# Altium schematic symbol library jlcpcb_2025_04_capacitors_extended_0603.schlib: 3668 symbols (part 15 of 20) (continued)
## FN18X821K500PSG
designator C?  Capacitance: 820pF  (hidden comment: *)
Capacitor, Ceramic (MLCC), 820pF, ±10%, 50V, X7R, ±10%, SMD 0603; Manufacturer: PSA(Prosperity Dielectrics); Manufacturer Part Number: FN18X821K500PSG; Package Size: 0603; JLCPCB Basic Part: No; JLCPCB Part Number: C565602; Supplier 1: LCSC; Category: Capacitors - MLCC; Supplier Part Number 1: C565602; Tolerance: ±10%; Voltage Rating: 50V; Temperature Coefficient: X7R; RoHS: Yes; ComponentLink1Description: Datasheet; ComponentLink1URL: https://wmsc.lcsc.com/wmsc/upload/file/pdf/v2/lcsc/2304140030_PSA-Prosperity-Dielectrics-FN18X821K500PSG_C565602.pdf; ComponentLink2Description: JLCPCB Part URL; ComponentLink2URL: https://jlcpcb.com/partdetail/C565602; ComponentLink3Description: LCSC Part URL; ComponentLink3URL: https://lcsc.com/product-detail/Multilayer-Ceramic-Capacitors-MLCC---SMD-SMT_PSAProsperity-Dielectrics-PSAProsperity-Dielectrics-FN18X821K500PSG_C565602.html
footprint CAP-0603 (0603 (1608M) Capacitor)
pins: 1, 2

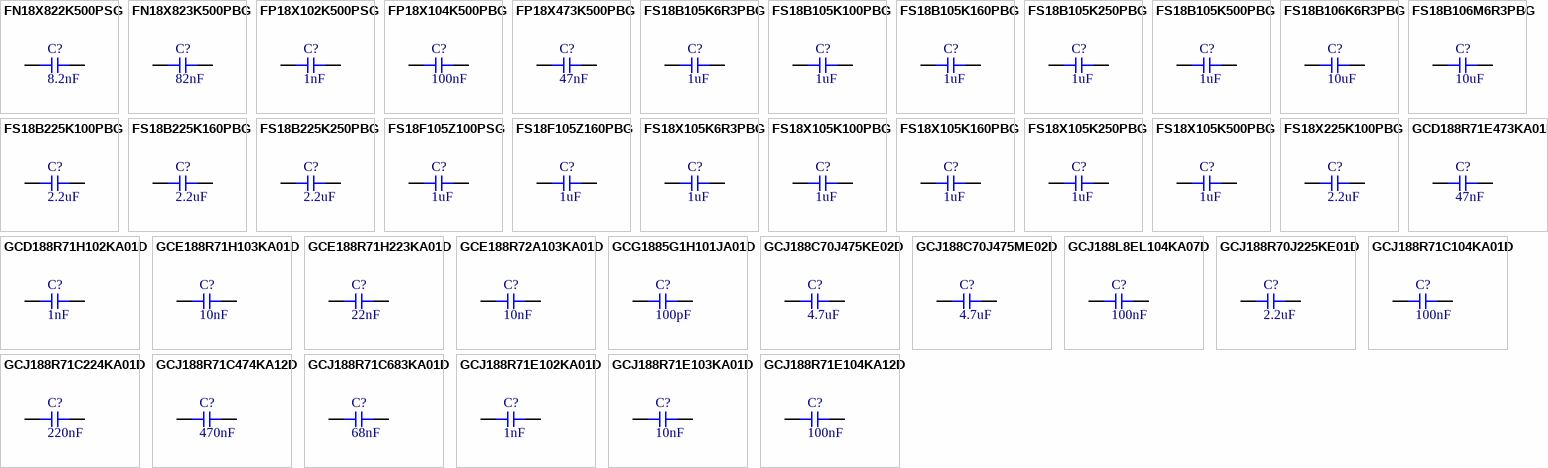
[diagram p66: symbols FN18X822K500PSG to GCJ188R71E104KA12D]

## FN18X822K500PSG
designator C?  Capacitance: 8.2nF  (hidden comment: *)
Capacitor, Ceramic (MLCC), 8.2nF, ±10%, 50V, X7R, ±10%, SMD 0603; Manufacturer: PSA(Prosperity Dielectrics); Manufacturer Part Number: FN18X822K500PSG; Package Size: 0603; JLCPCB Basic Part: No; JLCPCB Part Number: C565603; Supplier 1: LCSC; Category: Capacitors - MLCC; Supplier Part Number 1: C565603; Tolerance: ±10%; Voltage Rating: 50V; Temperature Coefficient: X7R; RoHS: Yes; ComponentLink1Description: Datasheet; ComponentLink1URL: https://wmsc.lcsc.com/wmsc/upload/file/pdf/v2/lcsc/2304140030_PSA-Prosperity-Dielectrics-FN18X822K500PSG_C565603.pdf; ComponentLink2Description: JLCPCB Part URL; ComponentLink2URL: https://jlcpcb.com/partdetail/C565603; ComponentLink3Description: LCSC Part URL; ComponentLink3URL: https://lcsc.com/product-detail/Multilayer-Ceramic-Capacitors-MLCC---SMD-SMT_PSAProsperity-Dielectrics-PSAProsperity-Dielectrics-FN18X822K500PSG_C565603.html
footprint CAP-0603 (0603 (1608M) Capacitor)
pins: 1, 2

## FN18X823K500PBG
designator C?  Capacitance: 82nF  (hidden comment: *)
Capacitor, Ceramic (MLCC), 82nF, ±10%, 50V, X7R, ±10%, SMD 0603; Manufacturer: PSA(Prosperity Dielectrics); Manufacturer Part Number: FN18X823K500PBG; Package Size: 0603; JLCPCB Basic Part: No; JLCPCB Part Number: C565604; Supplier 1: LCSC; Category: Capacitors - MLCC; Supplier Part Number 1: C565604; Tolerance: ±10%; Voltage Rating: 50V; Temperature Coefficient: X7R; RoHS: Yes; ComponentLink1Description: Datasheet; ComponentLink1URL: https://wmsc.lcsc.com/wmsc/upload/file/pdf/v2/lcsc/2304140030_PSA-Prosperity-Dielectrics-FN18X823K500PBG_C565604.pdf; ComponentLink2Description: JLCPCB Part URL; ComponentLink2URL: https://jlcpcb.com/partdetail/C565604; ComponentLink3Description: LCSC Part URL; ComponentLink3URL: https://lcsc.com/product-detail/Multilayer-Ceramic-Capacitors-MLCC---SMD-SMT_PSAProsperity-Dielectrics-PSAProsperity-Dielectrics-FN18X823K500PBG_C565604.html
footprint CAP-0603 (0603 (1608M) Capacitor)
pins: 1, 2

## FP18X102K500PSG
designator C?  Capacitance: 1nF  (hidden comment: *)
Capacitor, Ceramic (MLCC), 1nF, 50V, X7R, SMD 0603; Manufacturer: PSA(Prosperity Dielectrics); Manufacturer Part Number: FP18X102K500PSG; Package Size: 0603; JLCPCB Basic Part: No; JLCPCB Part Number: C2929176; Supplier 1: LCSC; Category: Capacitors - MLCC; Supplier Part Number 1: C2929176; Voltage Rating: 50V; Temperature Coefficient: X7R; RoHS: Yes; ComponentLink1Description: Datasheet; ComponentLink1URL: https://wmsc.lcsc.com/wmsc/upload/file/pdf/v2/lcsc/2201121400_PSA-Prosperity-Dielectrics-FP18X102K500PSG_C2929176.pdf; ComponentLink2Description: JLCPCB Part URL; ComponentLink2URL: https://jlcpcb.com/partdetail/C2929176; ComponentLink3Description: LCSC Part URL; ComponentLink3URL: https://lcsc.com/product-detail/Multilayer-Ceramic-Capacitors-MLCC---SMD-SMT_PSAProsperity-Dielectrics-PSAProsperity-Dielectrics-FP18X102K500PSG_C2929176.html
footprint CAP-0603 (0603 (1608M) Capacitor)
pins: 1, 2

## FP18X104K500PBG
designator C?  Capacitance: 100nF  (hidden comment: *)
Capacitor, Ceramic (MLCC), 100nF, 50V, X7R, SMD 0603; Manufacturer: PSA(Prosperity Dielectrics); Manufacturer Part Number: FP18X104K500PBG; Package Size: 0603; JLCPCB Basic Part: No; JLCPCB Part Number: C2929177; Supplier 1: LCSC; Category: Capacitors - MLCC; Supplier Part Number 1: C2929177; Voltage Rating: 50V; Temperature Coefficient: X7R; RoHS: Yes; ComponentLink1Description: Datasheet; ComponentLink1URL: https://wmsc.lcsc.com/wmsc/upload/file/pdf/v2/lcsc/2201121400_PSA-Prosperity-Dielectrics-FP18X104K500PBG_C2929177.pdf; ComponentLink2Description: JLCPCB Part URL; ComponentLink2URL: https://jlcpcb.com/partdetail/C2929177; ComponentLink3Description: LCSC Part URL; ComponentLink3URL: https://lcsc.com/product-detail/Multilayer-Ceramic-Capacitors-MLCC---SMD-SMT_PSAProsperity-Dielectrics-PSAProsperity-Dielectrics-FP18X104K500PBG_C2929177.html
footprint CAP-0603 (0603 (1608M) Capacitor)
pins: 1, 2

## FP18X473K500PBG
designator C?  Capacitance: 47nF  (hidden comment: *)
Capacitor, Ceramic (MLCC), 47nF, ±10%, 50V, X7R, ±10%, SMD 0603; Manufacturer: PSA(Prosperity Dielectrics); Manufacturer Part Number: FP18X473K500PBG; Package Size: 0603; JLCPCB Basic Part: No; JLCPCB Part Number: C525319; Supplier 1: LCSC; Category: Capacitors - MLCC; Supplier Part Number 1: C525319; Tolerance: ±10%; Voltage Rating: 50V; Temperature Coefficient: X7R; RoHS: Yes; ComponentLink1Description: Datasheet; ComponentLink1URL: https://wmsc.lcsc.com/wmsc/upload/file/pdf/v2/lcsc/2304140030_PSA-Prosperity-Dielectrics-FP18X473K500PBG_C525319.pdf; ComponentLink2Description: JLCPCB Part URL; ComponentLink2URL: https://jlcpcb.com/partdetail/C525319; ComponentLink3Description: LCSC Part URL; ComponentLink3URL: https://lcsc.com/product-detail/Multilayer-Ceramic-Capacitors-MLCC---SMD-SMT_PSAProsperity-Dielectrics-PSAProsperity-Dielectrics-FP18X473K500PBG_C525319.html
footprint CAP-0603 (0603 (1608M) Capacitor)
pins: 1, 2

## FS18B105K6R3PBG
designator C?  Capacitance: 1uF  (hidden comment: *)
Capacitor, Ceramic (MLCC), 1uF, ±10%, 6.3V, X5R, ±10%, SMD 0603; Manufacturer: PSA(Prosperity Dielectrics); Manufacturer Part Number: FS18B105K6R3PBG; Package Size: 0603; JLCPCB Basic Part: No; JLCPCB Part Number: C525331; Supplier 1: LCSC; Category: Capacitors - MLCC; Supplier Part Number 1: C525331; Tolerance: ±10%; Voltage Rating: 6.3V; Temperature Coefficient: X5R; RoHS: Yes; ComponentLink1Description: Datasheet; ComponentLink1URL: https://wmsc.lcsc.com/wmsc/upload/file/pdf/v2/lcsc/2304140030_PSA-Prosperity-Dielectrics-FS18B105K6R3PBG_C525331.pdf; ComponentLink2Description: JLCPCB Part URL; ComponentLink2URL: https://jlcpcb.com/partdetail/C525331; ComponentLink3Description: LCSC Part URL; ComponentLink3URL: https://lcsc.com/product-detail/Multilayer-Ceramic-Capacitors-MLCC---SMD-SMT_PSAProsperity-Dielectrics-PSAProsperity-Dielectrics-FS18B105K6R3PBG_C525331.html
footprint CAP-0603 (0603 (1608M) Capacitor)
pins: 1, 2

## FS18B105K100PBG
designator C?  Capacitance: 1uF  (hidden comment: *)
Capacitor, Ceramic (MLCC), 1uF, ±10%, 10V, X5R, ±10%, SMD 0603; Manufacturer: PSA(Prosperity Dielectrics); Manufacturer Part Number: FS18B105K100PBG; Package Size: 0603; JLCPCB Basic Part: No; JLCPCB Part Number: C363553; Supplier 1: LCSC; Category: Capacitors - MLCC; Supplier Part Number 1: C363553; Tolerance: ±10%; Voltage Rating: 10V; Temperature Coefficient: X5R; RoHS: Yes; ComponentLink1Description: Datasheet; ComponentLink1URL: https://wmsc.lcsc.com/wmsc/upload/file/pdf/v2/lcsc/2304140030_PSA-Prosperity-Dielectrics-FS18B105K100PBG_C363553.pdf; ComponentLink2Description: JLCPCB Part URL; ComponentLink2URL: https://jlcpcb.com/partdetail/C363553; ComponentLink3Description: LCSC Part URL; ComponentLink3URL: https://lcsc.com/product-detail/Multilayer-Ceramic-Capacitors-MLCC---SMD-SMT_PSAProsperity-Dielectrics-PSAProsperity-Dielectrics-FS18B105K100PBG_C363553.html
footprint CAP-0603 (0603 (1608M) Capacitor)
pins: 1, 2

## FS18B105K160PBG
designator C?  Capacitance: 1uF  (hidden comment: *)
Capacitor, Ceramic (MLCC), 1uF, ±10%, 16V, X5R, ±10%, SMD 0603; Manufacturer: PSA(Prosperity Dielectrics); Manufacturer Part Number: FS18B105K160PBG; Package Size: 0603; JLCPCB Basic Part: No; JLCPCB Part Number: C328910; Supplier 1: LCSC; Category: Capacitors - MLCC; Supplier Part Number 1: C328910; Tolerance: ±10%; Voltage Rating: 16V; Temperature Coefficient: X5R; RoHS: Yes; ComponentLink1Description: Datasheet; ComponentLink1URL: https://wmsc.lcsc.com/wmsc/upload/file/pdf/v2/lcsc/2304140030_PSA-Prosperity-Dielectrics-FS18B105K160PBG_C328910.pdf; ComponentLink2Description: JLCPCB Part URL; ComponentLink2URL: https://jlcpcb.com/partdetail/C328910; ComponentLink3Description: LCSC Part URL; ComponentLink3URL: https://lcsc.com/product-detail/Multilayer-Ceramic-Capacitors-MLCC---SMD-SMT_PSAProsperity-Dielectrics-PSAProsperity-Dielectrics-FS18B105K160PBG_C328910.html
footprint CAP-0603 (0603 (1608M) Capacitor)
pins: 1, 2

## FS18B105K250PBG
designator C?  Capacitance: 1uF  (hidden comment: *)
Capacitor, Ceramic (MLCC), 1uF, ±10%, 25V, X5R, ±10%, SMD 0603; Manufacturer: PSA(Prosperity Dielectrics); Manufacturer Part Number: FS18B105K250PBG; Package Size: 0603; JLCPCB Basic Part: No; JLCPCB Part Number: C525329; Supplier 1: LCSC; Category: Capacitors - MLCC; Supplier Part Number 1: C525329; Tolerance: ±10%; Voltage Rating: 25V; Temperature Coefficient: X5R; RoHS: Yes; ComponentLink1Description: Datasheet; ComponentLink1URL: https://wmsc.lcsc.com/wmsc/upload/file/pdf/v2/lcsc/2304140030_PSA-Prosperity-Dielectrics-FS18B105K250PBG_C525329.pdf; ComponentLink2Description: JLCPCB Part URL; ComponentLink2URL: https://jlcpcb.com/partdetail/C525329; ComponentLink3Description: LCSC Part URL; ComponentLink3URL: https://lcsc.com/product-detail/Multilayer-Ceramic-Capacitors-MLCC---SMD-SMT_PSAProsperity-Dielectrics-PSAProsperity-Dielectrics-FS18B105K250PBG_C525329.html
footprint CAP-0603 (0603 (1608M) Capacitor)
pins: 1, 2

## FS18B105K500PBG
designator C?  Capacitance: 1uF  (hidden comment: *)
Capacitor, Ceramic (MLCC), 1uF, ±10%, 50V, X5R, ±10%, SMD 0603; Manufacturer: PSA(Prosperity Dielectrics); Manufacturer Part Number: FS18B105K500PBG; Package Size: 0603; JLCPCB Basic Part: No; JLCPCB Part Number: C525330; Supplier 1: LCSC; Category: Capacitors - MLCC; Supplier Part Number 1: C525330; Tolerance: ±10%; Voltage Rating: 50V; Temperature Coefficient: X5R; RoHS: Yes; ComponentLink1Description: Datasheet; ComponentLink1URL: https://wmsc.lcsc.com/wmsc/upload/file/pdf/v2/lcsc/2304140030_PSA-Prosperity-Dielectrics-FS18B105K500PBG_C525330.pdf; ComponentLink2Description: JLCPCB Part URL; ComponentLink2URL: https://jlcpcb.com/partdetail/C525330; ComponentLink3Description: LCSC Part URL; ComponentLink3URL: https://lcsc.com/product-detail/Multilayer-Ceramic-Capacitors-MLCC---SMD-SMT_PSAProsperity-Dielectrics-PSAProsperity-Dielectrics-FS18B105K500PBG_C525330.html
footprint CAP-0603 (0603 (1608M) Capacitor)
pins: 1, 2

## FS18B106K6R3PBG
designator C?  Capacitance: 10uF  (hidden comment: *)
Capacitor, Ceramic (MLCC), 10uF, ±10%, 6.3V, ±10%, SMD 0603; Manufacturer: PSA(Prosperity Dielectrics); Manufacturer Part Number: FS18B106K6R3PBG; Package Size: 0603; JLCPCB Basic Part: No; JLCPCB Part Number: C2836875; Supplier 1: LCSC; Category: Capacitors - MLCC; Supplier Part Number 1: C2836875; Tolerance: ±10%; Voltage Rating: 6.3V; RoHS: Yes; ComponentLink1Description: Datasheet; ComponentLink1URL: https://wmsc.lcsc.com/wmsc/upload/file/pdf/v2/lcsc/2304140030_PSA-Prosperity-Dielectrics-FS18B106K6R3PBG_C2836875.pdf; ComponentLink2Description: JLCPCB Part URL; ComponentLink2URL: https://jlcpcb.com/partdetail/C2836875; ComponentLink3Description: LCSC Part URL; ComponentLink3URL: https://lcsc.com/product-detail/Multilayer-Ceramic-Capacitors-MLCC---SMD-SMT_PSAProsperity-Dielectrics-PSAProsperity-Dielectrics-FS18B106K6R3PBG_C2836875.html
footprint CAP-0603 (0603 (1608M) Capacitor)
pins: 1, 2

## FS18B106M6R3PBG
designator C?  Capacitance: 10uF  (hidden comment: *)
Capacitor, Ceramic (MLCC), 10uF, ±20%, 6.3V, ±20%, SMD 0603; Manufacturer: PSA(Prosperity Dielectrics); Manufacturer Part Number: FS18B106M6R3PBG; Package Size: 0603; JLCPCB Basic Part: No; JLCPCB Part Number: C2836876; Supplier 1: LCSC; Category: Capacitors - MLCC; Supplier Part Number 1: C2836876; Tolerance: ±20%; Voltage Rating: 6.3V; RoHS: Yes; ComponentLink1Description: Datasheet; ComponentLink1URL: https://wmsc.lcsc.com/wmsc/upload/file/pdf/v2/lcsc/2304140030_PSA-Prosperity-Dielectrics-FS18B106M6R3PBG_C2836876.pdf; ComponentLink2Description: JLCPCB Part URL; ComponentLink2URL: https://jlcpcb.com/partdetail/C2836876; ComponentLink3Description: LCSC Part URL; ComponentLink3URL: https://lcsc.com/product-detail/Multilayer-Ceramic-Capacitors-MLCC---SMD-SMT_PSAProsperity-Dielectrics-PSAProsperity-Dielectrics-FS18B106M6R3PBG_C2836876.html
footprint CAP-0603 (0603 (1608M) Capacitor)
pins: 1, 2

## FS18B225K100PBG
designator C?  Capacitance: 2.2uF  (hidden comment: *)
Capacitor, Ceramic (MLCC), 2.2uF, ±10%, 10V, X5R, ±10%, SMD 0603; Manufacturer: PSA(Prosperity Dielectrics); Manufacturer Part Number: FS18B225K100PBG; Package Size: 0603; JLCPCB Basic Part: No; JLCPCB Part Number: C2847427; Supplier 1: LCSC; Category: Capacitors - MLCC; Supplier Part Number 1: C2847427; Tolerance: ±10%; Voltage Rating: 10V; Temperature Coefficient: X5R; RoHS: Yes; ComponentLink1Description: Datasheet; ComponentLink1URL: https://wmsc.lcsc.com/wmsc/upload/file/pdf/v2/lcsc/2108142130_PSA-Prosperity-Dielectrics-FS18B225K100PBG_C2847427.pdf; ComponentLink2Description: JLCPCB Part URL; ComponentLink2URL: https://jlcpcb.com/partdetail/C2847427; ComponentLink3Description: LCSC Part URL; ComponentLink3URL: https://lcsc.com/product-detail/Multilayer-Ceramic-Capacitors-MLCC---SMD-SMT_PSAProsperity-Dielectrics-PSAProsperity-Dielectrics-FS18B225K100PBG_C2847427.html
footprint CAP-0603 (0603 (1608M) Capacitor)
pins: 1, 2

## FS18B225K160PBG
designator C?  Capacitance: 2.2uF  (hidden comment: *)
Capacitor, Ceramic (MLCC), 2.2uF, 16V, X5R, SMD 0603; Manufacturer: PSA(Prosperity Dielectrics); Manufacturer Part Number: FS18B225K160PBG; Package Size: 0603; JLCPCB Basic Part: No; JLCPCB Part Number: C2874748; Supplier 1: LCSC; Category: Capacitors - MLCC; Supplier Part Number 1: C2874748; Voltage Rating: 16V; Temperature Coefficient: X5R; RoHS: Yes; ComponentLink1Description: Datasheet; ComponentLink1URL: https://wmsc.lcsc.com/wmsc/upload/file/pdf/v2/lcsc/2108150330_PSA-Prosperity-Dielectrics-FS18B225K160PBG_C2874748.pdf; ComponentLink2Description: JLCPCB Part URL; ComponentLink2URL: https://jlcpcb.com/partdetail/C2874748; ComponentLink3Description: LCSC Part URL; ComponentLink3URL: https://lcsc.com/product-detail/Multilayer-Ceramic-Capacitors-MLCC---SMD-SMT_PSAProsperity-Dielectrics-PSAProsperity-Dielectrics-FS18B225K160PBG_C2874748.html
footprint CAP-0603 (0603 (1608M) Capacitor)
pins: 1, 2

## FS18B225K250PBG
designator C?  Capacitance: 2.2uF  (hidden comment: *)
Capacitor, Ceramic (MLCC), 2.2uF, 25V, X5R, SMD 0603; Manufacturer: PSA(Prosperity Dielectrics); Manufacturer Part Number: FS18B225K250PBG; Package Size: 0603; JLCPCB Basic Part: No; JLCPCB Part Number: C2929194; Supplier 1: LCSC; Category: Capacitors - MLCC; Supplier Part Number 1: C2929194; Voltage Rating: 25V; Temperature Coefficient: X5R; RoHS: Yes; ComponentLink1Description: Datasheet; ComponentLink1URL: https://wmsc.lcsc.com/wmsc/upload/file/pdf/v2/lcsc/2201121400_PSA-Prosperity-Dielectrics-FS18B225K250PBG_C2929194.pdf; ComponentLink2Description: JLCPCB Part URL; ComponentLink2URL: https://jlcpcb.com/partdetail/C2929194; ComponentLink3Description: LCSC Part URL; ComponentLink3URL: https://lcsc.com/product-detail/Multilayer-Ceramic-Capacitors-MLCC---SMD-SMT_PSAProsperity-Dielectrics-PSAProsperity-Dielectrics-FS18B225K250PBG_C2929194.html
footprint CAP-0603 (0603 (1608M) Capacitor)
pins: 1, 2

## FS18F105Z100PSG
designator C?  Capacitance: 1uF  (hidden comment: *)
Capacitor, Ceramic (MLCC), 1uF, 10V, Y5V, SMD 0603; Manufacturer: PSA(Prosperity Dielectrics); Manufacturer Part Number: FS18F105Z100PSG; Temperature Rating: -20%~+80%; Package Size: 0603; JLCPCB Basic Part: No; JLCPCB Part Number: C363559; Supplier 1: LCSC; Category: Capacitors - MLCC; Supplier Part Number 1: C363559; Voltage Rating: 10V; Temperature Coefficient: Y5V; RoHS: Yes; ComponentLink1Description: Datasheet; ComponentLink1URL: https://wmsc.lcsc.com/wmsc/upload/file/pdf/v2/lcsc/2304140030_PSA-Prosperity-Dielectrics-FS18F105Z100PSG_C363559.pdf; ComponentLink2Description: JLCPCB Part URL; ComponentLink2URL: https://jlcpcb.com/partdetail/C363559; ComponentLink3Description: LCSC Part URL; ComponentLink3URL: https://lcsc.com/product-detail/Multilayer-Ceramic-Capacitors-MLCC---SMD-SMT_PSAProsperity-Dielectrics-PSAProsperity-Dielectrics-FS18F105Z100PSG_C363559.html
footprint CAP-0603 (0603 (1608M) Capacitor)
pins: 1, 2

## FS18F105Z160PBG
designator C?  Capacitance: 1uF  (hidden comment: *)
Capacitor, Ceramic (MLCC), 1uF, 16V, Y5V, SMD 0603; Manufacturer: PSA(Prosperity Dielectrics); Manufacturer Part Number: FS18F105Z160PBG; Temperature Rating: -20%~+80%; Package Size: 0603; JLCPCB Basic Part: No; JLCPCB Part Number: C363560; Supplier 1: LCSC; Category: Capacitors - MLCC; Supplier Part Number 1: C363560; Voltage Rating: 16V; Temperature Coefficient: Y5V; RoHS: Yes; ComponentLink1Description: Datasheet; ComponentLink1URL: https://wmsc.lcsc.com/wmsc/upload/file/pdf/v2/lcsc/2304140030_PSA-Prosperity-Dielectrics-FS18F105Z160PBG_C363560.pdf; ComponentLink2Description: JLCPCB Part URL; ComponentLink2URL: https://jlcpcb.com/partdetail/C363560; ComponentLink3Description: LCSC Part URL; ComponentLink3URL: https://lcsc.com/product-detail/Multilayer-Ceramic-Capacitors-MLCC---SMD-SMT_PSAProsperity-Dielectrics-PSAProsperity-Dielectrics-FS18F105Z160PBG_C363560.html
footprint CAP-0603 (0603 (1608M) Capacitor)
pins: 1, 2

## FS18X105K6R3PBG
designator C?  Capacitance: 1uF  (hidden comment: *)
Capacitor, Ceramic (MLCC), 1uF, ±10%, 6.3V, X7R, ±10%, SMD 0603; Manufacturer: PSA(Prosperity Dielectrics); Manufacturer Part Number: FS18X105K6R3PBG; Package Size: 0603; JLCPCB Basic Part: No; JLCPCB Part Number: C525335; Supplier 1: LCSC; Category: Capacitors - MLCC; Supplier Part Number 1: C525335; Tolerance: ±10%; Voltage Rating: 6.3V; Temperature Coefficient: X7R; RoHS: Yes; ComponentLink1Description: Datasheet; ComponentLink1URL: https://wmsc.lcsc.com/wmsc/upload/file/pdf/v2/lcsc/2304140030_PSA-Prosperity-Dielectrics-FS18X105K6R3PBG_C525335.pdf; ComponentLink2Description: JLCPCB Part URL; ComponentLink2URL: https://jlcpcb.com/partdetail/C525335; ComponentLink3Description: LCSC Part URL; ComponentLink3URL: https://lcsc.com/product-detail/Multilayer-Ceramic-Capacitors-MLCC---SMD-SMT_PSAProsperity-Dielectrics-PSAProsperity-Dielectrics-FS18X105K6R3PBG_C525335.html
footprint CAP-0603 (0603 (1608M) Capacitor)
pins: 1, 2

## FS18X105K100PBG
designator C?  Capacitance: 1uF  (hidden comment: *)
Capacitor, Ceramic (MLCC), 1uF, ±10%, 10V, X7R, ±10%, SMD 0603; Manufacturer: PSA(Prosperity Dielectrics); Manufacturer Part Number: FS18X105K100PBG; Package Size: 0603; JLCPCB Basic Part: No; JLCPCB Part Number: C525332; Supplier 1: LCSC; Category: Capacitors - MLCC; Supplier Part Number 1: C525332; Tolerance: ±10%; Voltage Rating: 10V; Temperature Coefficient: X7R; RoHS: Yes; ComponentLink1Description: Datasheet; ComponentLink1URL: https://wmsc.lcsc.com/wmsc/upload/file/pdf/v2/lcsc/2304140030_PSA-Prosperity-Dielectrics-FS18X105K100PBG_C525332.pdf; ComponentLink2Description: JLCPCB Part URL; ComponentLink2URL: https://jlcpcb.com/partdetail/C525332; ComponentLink3Description: LCSC Part URL; ComponentLink3URL: https://lcsc.com/product-detail/Multilayer-Ceramic-Capacitors-MLCC---SMD-SMT_PSAProsperity-Dielectrics-PSAProsperity-Dielectrics-FS18X105K100PBG_C525332.html
footprint CAP-0603 (0603 (1608M) Capacitor)
pins: 1, 2

## FS18X105K160PBG
designator C?  Capacitance: 1uF  (hidden comment: *)
Capacitor, Ceramic (MLCC), 1uF, ±10%, 16V, X7R, ±10%, SMD 0603; Manufacturer: PSA(Prosperity Dielectrics); Manufacturer Part Number: FS18X105K160PBG; Package Size: 0603; JLCPCB Basic Part: No; JLCPCB Part Number: C436246; Supplier 1: LCSC; Category: Capacitors - MLCC; Supplier Part Number 1: C436246; Tolerance: ±10%; Voltage Rating: 16V; Temperature Coefficient: X7R; RoHS: Yes; ComponentLink1Description: Datasheet; ComponentLink1URL: https://wmsc.lcsc.com/wmsc/upload/file/pdf/v2/lcsc/2304140030_PSA-Prosperity-Dielectrics-FS18X105K160PBG_C436246.pdf; ComponentLink2Description: JLCPCB Part URL; ComponentLink2URL: https://jlcpcb.com/partdetail/C436246; ComponentLink3Description: LCSC Part URL; ComponentLink3URL: https://lcsc.com/product-detail/Multilayer-Ceramic-Capacitors-MLCC---SMD-SMT_PSAProsperity-Dielectrics-PSAProsperity-Dielectrics-FS18X105K160PBG_C436246.html
footprint CAP-0603 (0603 (1608M) Capacitor)
pins: 1, 2

## FS18X105K250PBG
designator C?  Capacitance: 1uF  (hidden comment: *)
Capacitor, Ceramic (MLCC), 1uF, ±10%, 25V, X7R, ±10%, SMD 0603; Manufacturer: PSA(Prosperity Dielectrics); Manufacturer Part Number: FS18X105K250PBG; Package Size: 0603; JLCPCB Basic Part: No; JLCPCB Part Number: C525333; Supplier 1: LCSC; Category: Capacitors - MLCC; Supplier Part Number 1: C525333; Tolerance: ±10%; Voltage Rating: 25V; Temperature Coefficient: X7R; RoHS: Yes; ComponentLink1Description: Datasheet; ComponentLink1URL: https://wmsc.lcsc.com/wmsc/upload/file/pdf/v2/lcsc/2304140030_PSA-Prosperity-Dielectrics-FS18X105K250PBG_C525333.pdf; ComponentLink2Description: JLCPCB Part URL; ComponentLink2URL: https://jlcpcb.com/partdetail/C525333; ComponentLink3Description: LCSC Part URL; ComponentLink3URL: https://lcsc.com/product-detail/Multilayer-Ceramic-Capacitors-MLCC---SMD-SMT_PSAProsperity-Dielectrics-PSAProsperity-Dielectrics-FS18X105K250PBG_C525333.html
footprint CAP-0603 (0603 (1608M) Capacitor)
pins: 1, 2

## FS18X105K500PBG
designator C?  Capacitance: 1uF  (hidden comment: *)
Capacitor, Ceramic (MLCC), 1uF, ±10%, 50V, X7R, ±10%, SMD 0603; Manufacturer: PSA(Prosperity Dielectrics); Manufacturer Part Number: FS18X105K500PBG; Package Size: 0603; JLCPCB Basic Part: No; JLCPCB Part Number: C525334; Supplier 1: LCSC; Category: Capacitors - MLCC; Supplier Part Number 1: C525334; Tolerance: ±10%; Voltage Rating: 50V; Temperature Coefficient: X7R; RoHS: Yes; ComponentLink1Description: Datasheet; ComponentLink1URL: https://wmsc.lcsc.com/wmsc/upload/file/pdf/v2/lcsc/2304140030_PSA-Prosperity-Dielectrics-FS18X105K500PBG_C525334.pdf; ComponentLink2Description: JLCPCB Part URL; ComponentLink2URL: https://jlcpcb.com/partdetail/C525334; ComponentLink3Description: LCSC Part URL; ComponentLink3URL: https://lcsc.com/product-detail/Multilayer-Ceramic-Capacitors-MLCC---SMD-SMT_PSAProsperity-Dielectrics-PSAProsperity-Dielectrics-FS18X105K500PBG_C525334.html
footprint CAP-0603 (0603 (1608M) Capacitor)
pins: 1, 2

## FS18X225K100PBG
designator C?  Capacitance: 2.2uF  (hidden comment: *)
Capacitor, Ceramic (MLCC), 2.2uF, 10V, X7R, SMD 0603; Manufacturer: PSA(Prosperity Dielectrics); Manufacturer Part Number: FS18X225K100PBG; Package Size: 0603; JLCPCB Basic Part: No; JLCPCB Part Number: C2929195; Supplier 1: LCSC; Category: Capacitors - MLCC; Supplier Part Number 1: C2929195; Voltage Rating: 10V; Temperature Coefficient: X7R; RoHS: Yes; ComponentLink1Description: Datasheet; ComponentLink1URL: https://wmsc.lcsc.com/wmsc/upload/file/pdf/v2/lcsc/2201121400_PSA-Prosperity-Dielectrics-FS18X225K100PBG_C2929195.pdf; ComponentLink2Description: JLCPCB Part URL; ComponentLink2URL: https://jlcpcb.com/partdetail/C2929195; ComponentLink3Description: LCSC Part URL; ComponentLink3URL: https://lcsc.com/product-detail/Multilayer-Ceramic-Capacitors-MLCC---SMD-SMT_PSAProsperity-Dielectrics-PSAProsperity-Dielectrics-FS18X225K100PBG_C2929195.html
footprint CAP-0603 (0603 (1608M) Capacitor)
pins: 1, 2

## GCD188R71E473KA01D
designator C?  Capacitance: 47nF  (hidden comment: *)
Capacitor, Ceramic (MLCC), 47nF, ±10%, 25V, X7R, ±10%, SMD 0603; Manufacturer: Murata Electronics; Manufacturer Part Number: GCD188R71E473KA01D; Package Size: 0603; JLCPCB Basic Part: No; JLCPCB Part Number: C2203949; Supplier 1: LCSC; Category: Capacitors - MLCC; Supplier Part Number 1: C2203949; Tolerance: ±10%; Voltage Rating: 25V; Temperature Coefficient: X7R; RoHS: Yes; ComponentLink1Description: Datasheet; ComponentLink1URL: https://wmsc.lcsc.com/wmsc/upload/file/pdf/v2/lcsc/2308111552_Murata-Electronics-GCD188R71E473KA01D_C2203949.pdf; ComponentLink2Description: JLCPCB Part URL; ComponentLink2URL: https://jlcpcb.com/partdetail/C2203949; ComponentLink3Description: LCSC Part URL; ComponentLink3URL: https://lcsc.com/product-detail/Multilayer-Ceramic-Capacitors-MLCC---SMD-SMT_Murata-Electronics-Murata-Electronics-GCD188R71E473KA01D_C2203949.html
footprint CAP-0603 (0603 (1608M) Capacitor)
pins: 1, 2

## GCD188R71H102KA01D
designator C?  Capacitance: 1nF  (hidden comment: *)
Capacitor, Ceramic (MLCC), 1nF, ±10%, 50V, X7R, ±10%, SMD 0603; Manufacturer: Murata Electronics; Manufacturer Part Number: GCD188R71H102KA01D; Package Size: 0603; JLCPCB Basic Part: No; JLCPCB Part Number: C161106; Supplier 1: LCSC; Category: Capacitors - MLCC; Supplier Part Number 1: C161106; Tolerance: ±10%; Voltage Rating: 50V; Temperature Coefficient: X7R; RoHS: Yes; ComponentLink1Description: Datasheet; ComponentLink1URL: https://wmsc.lcsc.com/wmsc/upload/file/pdf/v2/lcsc/1810311135_Murata-Electronics-GCD188R71H102KA01D_C161106.pdf; ComponentLink2Description: JLCPCB Part URL; ComponentLink2URL: https://jlcpcb.com/partdetail/C161106; ComponentLink3Description: LCSC Part URL; ComponentLink3URL: https://lcsc.com/product-detail/Multilayer-Ceramic-Capacitors-MLCC---SMD-SMT_Murata-Electronics-Murata-Electronics-GCD188R71H102KA01D_C161106.html
footprint CAP-0603 (0603 (1608M) Capacitor)
pins: 1, 2

## GCE188R71H103KA01D
designator C?  Capacitance: 10nF  (hidden comment: *)
Capacitor, Ceramic (MLCC), 10nF, ±10%, 50V, X7R, ±10%, SMD 0603; Manufacturer: Murata Electronics; Manufacturer Part Number: GCE188R71H103KA01D; Package Size: 0603; JLCPCB Basic Part: No; JLCPCB Part Number: C2200541; Supplier 1: LCSC; Category: Capacitors - MLCC; Supplier Part Number 1: C2200541; Tolerance: ±10%; Voltage Rating: 50V; Temperature Coefficient: X7R; RoHS: Yes; ComponentLink1Description: Datasheet; ComponentLink1URL: https://wmsc.lcsc.com/wmsc/upload/file/pdf/v2/lcsc/2308111552_Murata-Electronics-GCE188R71H103KA01D_C2200541.pdf; ComponentLink2Description: JLCPCB Part URL; ComponentLink2URL: https://jlcpcb.com/partdetail/C2200541; ComponentLink3Description: LCSC Part URL; ComponentLink3URL: https://lcsc.com/product-detail/Multilayer-Ceramic-Capacitors-MLCC---SMD-SMT_Murata-Electronics-Murata-Electronics-GCE188R71H103KA01D_C2200541.html
footprint CAP-0603 (0603 (1608M) Capacitor)
pins: 1, 2

## GCE188R71H223KA01D
designator C?  Capacitance: 22nF  (hidden comment: *)
Capacitor, Ceramic (MLCC), 22nF, ±10%, 50V, X7R, ±10%, SMD 0603; Manufacturer: Murata Electronics; Manufacturer Part Number: GCE188R71H223KA01D; Package Size: 0603; JLCPCB Basic Part: No; JLCPCB Part Number: C408117; Supplier 1: LCSC; Category: Capacitors - MLCC; Supplier Part Number 1: C408117; Tolerance: ±10%; Voltage Rating: 50V; Temperature Coefficient: X7R; RoHS: Yes; ComponentLink1Description: Datasheet; ComponentLink1URL: https://wmsc.lcsc.com/wmsc/upload/file/pdf/v2/lcsc/2304140030_Murata-Electronics-GCE188R71H223KA01D_C408117.pdf; ComponentLink2Description: JLCPCB Part URL; ComponentLink2URL: https://jlcpcb.com/partdetail/C408117; ComponentLink3Description: LCSC Part URL; ComponentLink3URL: https://lcsc.com/product-detail/Multilayer-Ceramic-Capacitors-MLCC---SMD-SMT_Murata-Electronics-Murata-Electronics-GCE188R71H223KA01D_C408117.html
footprint CAP-0603 (0603 (1608M) Capacitor)
pins: 1, 2

## GCE188R72A103KA01D
designator C?  Capacitance: 10nF  (hidden comment: *)
Capacitor, Ceramic (MLCC), 10nF, ±10%, 100V, X7R, ±10%, SMD 0603; Manufacturer: Murata Electronics; Manufacturer Part Number: GCE188R72A103KA01D; Package Size: 0603; JLCPCB Basic Part: No; JLCPCB Part Number: C3840638; Supplier 1: LCSC; Category: Capacitors - MLCC; Supplier Part Number 1: C3840638; Tolerance: ±10%; Voltage Rating: 100V; Temperature Coefficient: X7R; RoHS: Yes; ComponentLink1Description: Datasheet; ComponentLink1URL: https://wmsc.lcsc.com/wmsc/upload/file/pdf/v2/lcsc/2308111744_Murata-Electronics-GCE188R72A103KA01D_C3840638.pdf; ComponentLink2Description: JLCPCB Part URL; ComponentLink2URL: https://jlcpcb.com/partdetail/C3840638; ComponentLink3Description: LCSC Part URL; ComponentLink3URL: https://lcsc.com/product-detail/Multilayer-Ceramic-Capacitors-MLCC---SMD-SMT_Murata-Electronics-Murata-Electronics-GCE188R72A103KA01D_C3840638.html
footprint CAP-0603 (0603 (1608M) Capacitor)
pins: 1, 2

## GCG1885G1H101JA01D
designator C?  Capacitance: 100pF  (hidden comment: *)
Capacitor, Ceramic (MLCC), 100pF, ±5%, 50V, X8G, ±5%, SMD 0603; Manufacturer: Murata Electronics; Manufacturer Part Number: GCG1885G1H101JA01D; Package Size: 0603; JLCPCB Basic Part: No; JLCPCB Part Number: C1864414; Supplier 1: LCSC; Category: Capacitors - MLCC; Supplier Part Number 1: C1864414; Tolerance: ±5%; Voltage Rating: 50V; Temperature Coefficient: X8G; RoHS: Yes; ComponentLink1Description: Datasheet; ComponentLink1URL: https://wmsc.lcsc.com/wmsc/upload/file/pdf/v2/lcsc/2201271800_Murata-Electronics-GCG1885G1H101JA01D_C1864414.pdf; ComponentLink2Description: JLCPCB Part URL; ComponentLink2URL: https://jlcpcb.com/partdetail/C1864414; ComponentLink3Description: LCSC Part URL; ComponentLink3URL: https://lcsc.com/product-detail/Multilayer-Ceramic-Capacitors-MLCC---SMD-SMT_Murata-Electronics-Murata-Electronics-GCG1885G1H101JA01D_C1864414.html
footprint CAP-0603 (0603 (1608M) Capacitor)
pins: 1, 2

## GCJ188C70J475KE02D
designator C?  Capacitance: 4.7uF  (hidden comment: *)
Capacitor, Ceramic (MLCC), 4.7uF, ±10%, 6.3V, X7S, ±10%, SMD 0603; Manufacturer: Murata Electronics; Manufacturer Part Number: GCJ188C70J475KE02D; Package Size: 0603; JLCPCB Basic Part: No; JLCPCB Part Number: C437419; Supplier 1: LCSC; Category: Capacitors - MLCC; Supplier Part Number 1: C437419; Tolerance: ±10%; Voltage Rating: 6.3V; Temperature Coefficient: X7S; RoHS: Yes; ComponentLink1Description: Datasheet; ComponentLink1URL: https://wmsc.lcsc.com/wmsc/upload/file/pdf/v2/lcsc/1912111437_Murata-Electronics-GCJ188C70J475KE02D_C437419.pdf; ComponentLink2Description: JLCPCB Part URL; ComponentLink2URL: https://jlcpcb.com/partdetail/C437419; ComponentLink3Description: LCSC Part URL; ComponentLink3URL: https://lcsc.com/product-detail/Multilayer-Ceramic-Capacitors-MLCC---SMD-SMT_Murata-Electronics-Murata-Electronics-GCJ188C70J475KE02D_C437419.html
footprint CAP-0603 (0603 (1608M) Capacitor)
pins: 1, 2

## GCJ188C70J475ME02D
designator C?  Capacitance: 4.7uF  (hidden comment: *)
Capacitor, Ceramic (MLCC), 4.7uF, ±20%, 6.3V, X7S, ±20%, SMD 0603; Manufacturer: Murata Electronics; Manufacturer Part Number: GCJ188C70J475ME02D; Package Size: 0603; JLCPCB Basic Part: No; JLCPCB Part Number: C907730; Supplier 1: LCSC; Category: Capacitors - MLCC; Supplier Part Number 1: C907730; Tolerance: ±20%; Voltage Rating: 6.3V; Temperature Coefficient: X7S; RoHS: Yes; ComponentLink1Description: Datasheet; ComponentLink1URL: https://wmsc.lcsc.com/wmsc/upload/file/pdf/v2/lcsc/2201242100_Murata-Electronics-GCJ188C70J475ME02D_C907730.pdf; ComponentLink2Description: JLCPCB Part URL; ComponentLink2URL: https://jlcpcb.com/partdetail/C907730; ComponentLink3Description: LCSC Part URL; ComponentLink3URL: https://lcsc.com/product-detail/Multilayer-Ceramic-Capacitors-MLCC---SMD-SMT_Murata-Electronics-Murata-Electronics-GCJ188C70J475ME02D_C907730.html
footprint CAP-0603 (0603 (1608M) Capacitor)
pins: 1, 2

## GCJ188L8EL104KA07D
designator C?  Capacitance: 100nF  (hidden comment: *)
Capacitor, Ceramic (MLCC), 100nF, ±10%, 100V, X8L, ±10%, SMD 0603; Manufacturer: Murata Electronics; Manufacturer Part Number: GCJ188L8EL104KA07D; Package Size: 0603; JLCPCB Basic Part: No; JLCPCB Part Number: C710617; Supplier 1: LCSC; Category: Capacitors - MLCC; Supplier Part Number 1: C710617; Tolerance: ±10%; Voltage Rating: 100V; Temperature Coefficient: X8L; RoHS: Yes; ComponentLink1Description: Datasheet; ComponentLink1URL: https://wmsc.lcsc.com/wmsc/upload/file/pdf/v2/lcsc/2308111555_Murata-Electronics-GCJ188L8EL104KA07D_C710617.pdf; ComponentLink2Description: JLCPCB Part URL; ComponentLink2URL: https://jlcpcb.com/partdetail/C710617; ComponentLink3Description: LCSC Part URL; ComponentLink3URL: https://lcsc.com/product-detail/Multilayer-Ceramic-Capacitors-MLCC---SMD-SMT_Murata-Electronics-Murata-Electronics-GCJ188L8EL104KA07D_C710617.html
footprint CAP-0603 (0603 (1608M) Capacitor)
pins: 1, 2

## GCJ188R70J225KE01D
designator C?  Capacitance: 2.2uF  (hidden comment: *)
Capacitor, Ceramic (MLCC), 2.2uF, ±10%, 6.3V, ±10%, SMD 0603; Manufacturer: Murata Electronics; Manufacturer Part Number: GCJ188R70J225KE01D; Package Size: 0603; JLCPCB Basic Part: No; JLCPCB Part Number: C883605; Supplier 1: LCSC; Category: Capacitors - MLCC; Supplier Part Number 1: C883605; Tolerance: ±10%; Voltage Rating: 6.3V; RoHS: Yes; ComponentLink1Description: Datasheet; ComponentLink1URL: https://wmsc.lcsc.com/wmsc/upload/file/pdf/v2/lcsc/2304140030_Murata-Electronics-GCJ188R70J225KE01D_C883605.pdf; ComponentLink2Description: JLCPCB Part URL; ComponentLink2URL: https://jlcpcb.com/partdetail/C883605; ComponentLink3Description: LCSC Part URL; ComponentLink3URL: https://lcsc.com/product-detail/Multilayer-Ceramic-Capacitors-MLCC---SMD-SMT_Murata-Electronics-Murata-Electronics-GCJ188R70J225KE01D_C883605.html
footprint CAP-0603 (0603 (1608M) Capacitor)
pins: 1, 2

## GCJ188R71C104KA01D
designator C?  Capacitance: 100nF  (hidden comment: *)
Capacitor, Ceramic (MLCC), 100nF, ±10%, 16V, X7R, ±10%, SMD 0603; Manufacturer: Murata Electronics; Manufacturer Part Number: GCJ188R71C104KA01D; Package Size: 0603; JLCPCB Basic Part: No; JLCPCB Part Number: C710619; Supplier 1: LCSC; Category: Capacitors - MLCC; Supplier Part Number 1: C710619; Tolerance: ±10%; Voltage Rating: 16V; Temperature Coefficient: X7R; RoHS: Yes; ComponentLink1Description: Datasheet; ComponentLink1URL: https://wmsc.lcsc.com/wmsc/upload/file/pdf/v2/lcsc/2308111554_Murata-Electronics-GCJ188R71C104KA01D_C710619.pdf; ComponentLink2Description: JLCPCB Part URL; ComponentLink2URL: https://jlcpcb.com/partdetail/C710619; ComponentLink3Description: LCSC Part URL; ComponentLink3URL: https://lcsc.com/product-detail/Multilayer-Ceramic-Capacitors-MLCC---SMD-SMT_Murata-Electronics-Murata-Electronics-GCJ188R71C104KA01D_C710619.html
footprint CAP-0603 (0603 (1608M) Capacitor)
pins: 1, 2

## GCJ188R71C224KA01D
designator C?  Capacitance: 220nF  (hidden comment: *)
Capacitor, Ceramic (MLCC), 220nF, ±10%, ±10%, SMD 0603; Manufacturer: Murata Electronics; Manufacturer Part Number: GCJ188R71C224KA01D; Package Size: 0603; JLCPCB Basic Part: No; JLCPCB Part Number: C883604; Supplier 1: LCSC; Category: Capacitors - MLCC; Supplier Part Number 1: C883604; Tolerance: ±10%; RoHS: Yes; ComponentLink1Description: Datasheet; ComponentLink1URL: https://wmsc.lcsc.com/wmsc/upload/file/pdf/v2/lcsc/2304140030_Murata-Electronics-GCJ188R71C224KA01D_C883604.pdf; ComponentLink2Description: JLCPCB Part URL; ComponentLink2URL: https://jlcpcb.com/partdetail/C883604; ComponentLink3Description: LCSC Part URL; ComponentLink3URL: https://lcsc.com/product-detail/Multilayer-Ceramic-Capacitors-MLCC---SMD-SMT_Murata-Electronics-Murata-Electronics-GCJ188R71C224KA01D_C883604.html
footprint CAP-0603 (0603 (1608M) Capacitor)
pins: 1, 2

## GCJ188R71C474KA12D
designator C?  Capacitance: 470nF  (hidden comment: *)
Capacitor, Ceramic (MLCC), 470nF, ±10%, 16V, X7R, ±10%, SMD 0603; Manufacturer: Murata Electronics; Manufacturer Part Number: GCJ188R71C474KA12D; Package Size: 0603; JLCPCB Basic Part: No; JLCPCB Part Number: C354393; Supplier 1: LCSC; Category: Capacitors - MLCC; Supplier Part Number 1: C354393; Tolerance: ±10%; Voltage Rating: 16V; Temperature Coefficient: X7R; RoHS: Yes; ComponentLink1Description: Datasheet; ComponentLink1URL: https://wmsc.lcsc.com/wmsc/upload/file/pdf/v2/lcsc/1912111437_Murata-Electronics-GCJ188R71C474KA12D_C354393.pdf; ComponentLink2Description: JLCPCB Part URL; ComponentLink2URL: https://jlcpcb.com/partdetail/C354393; ComponentLink3Description: LCSC Part URL; ComponentLink3URL: https://lcsc.com/product-detail/Multilayer-Ceramic-Capacitors-MLCC---SMD-SMT_Murata-Electronics-Murata-Electronics-GCJ188R71C474KA12D_C354393.html
footprint CAP-0603 (0603 (1608M) Capacitor)
pins: 1, 2

## GCJ188R71C683KA01D
designator C?  Capacitance: 68nF  (hidden comment: *)
Capacitor, Ceramic (MLCC), 68nF, ±10%, 16V, X7R, ±10%, SMD 0603; Manufacturer: Murata Electronics; Manufacturer Part Number: GCJ188R71C683KA01D; Package Size: 0603; JLCPCB Basic Part: No; JLCPCB Part Number: C354392; Supplier 1: LCSC; Category: Capacitors - MLCC; Supplier Part Number 1: C354392; Tolerance: ±10%; Voltage Rating: 16V; Temperature Coefficient: X7R; RoHS: Yes; ComponentLink1Description: Datasheet; ComponentLink1URL: https://wmsc.lcsc.com/wmsc/upload/file/pdf/v2/lcsc/1912111437_Murata-Electronics-GCJ188R71C683KA01D_C354392.pdf; ComponentLink2Description: JLCPCB Part URL; ComponentLink2URL: https://jlcpcb.com/partdetail/C354392; ComponentLink3Description: LCSC Part URL; ComponentLink3URL: https://lcsc.com/product-detail/Multilayer-Ceramic-Capacitors-MLCC---SMD-SMT_Murata-Electronics-Murata-Electronics-GCJ188R71C683KA01D_C354392.html
footprint CAP-0603 (0603 (1608M) Capacitor)
pins: 1, 2

## GCJ188R71E102KA01D
designator C?  Capacitance: 1nF  (hidden comment: *)
Capacitor, Ceramic (MLCC), 1nF, ±10%, 25V, X7R, ±10%, SMD 0603; Manufacturer: Murata Electronics; Manufacturer Part Number: GCJ188R71E102KA01D; Package Size: 0603; JLCPCB Basic Part: No; JLCPCB Part Number: C363952; Supplier 1: LCSC; Category: Capacitors - MLCC; Supplier Part Number 1: C363952; Tolerance: ±10%; Voltage Rating: 25V; Temperature Coefficient: X7R; RoHS: Yes; ComponentLink1Description: Datasheet; ComponentLink1URL: https://wmsc.lcsc.com/wmsc/upload/file/pdf/v2/lcsc/1912111437_Murata-Electronics-GCJ188R71E102KA01D_C363952.pdf; ComponentLink2Description: JLCPCB Part URL; ComponentLink2URL: https://jlcpcb.com/partdetail/C363952; ComponentLink3Description: LCSC Part URL; ComponentLink3URL: https://lcsc.com/product-detail/Multilayer-Ceramic-Capacitors-MLCC---SMD-SMT_Murata-Electronics-Murata-Electronics-GCJ188R71E102KA01D_C363952.html
footprint CAP-0603 (0603 (1608M) Capacitor)
pins: 1, 2

## GCJ188R71E103KA01D
designator C?  Capacitance: 10nF  (hidden comment: *)
Capacitor, Ceramic (MLCC), 10nF, ±10%, 25V, X7R, ±10%, SMD 0603; Manufacturer: Murata Electronics; Manufacturer Part Number: GCJ188R71E103KA01D; Package Size: 0603; JLCPCB Basic Part: No; JLCPCB Part Number: C363956; Supplier 1: LCSC; Category: Capacitors - MLCC; Supplier Part Number 1: C363956; Tolerance: ±10%; Voltage Rating: 25V; Temperature Coefficient: X7R; RoHS: Yes; ComponentLink1Description: Datasheet; ComponentLink1URL: https://wmsc.lcsc.com/wmsc/upload/file/pdf/v2/lcsc/1912111437_Murata-Electronics-GCJ188R71E103KA01D_C363956.pdf; ComponentLink2Description: JLCPCB Part URL; ComponentLink2URL: https://jlcpcb.com/partdetail/C363956; ComponentLink3Description: LCSC Part URL; ComponentLink3URL: https://lcsc.com/product-detail/Multilayer-Ceramic-Capacitors-MLCC---SMD-SMT_Murata-Electronics-Murata-Electronics-GCJ188R71E103KA01D_C363956.html
footprint CAP-0603 (0603 (1608M) Capacitor)
pins: 1, 2

## GCJ188R71E104KA12D
designator C?  Capacitance: 100nF  (hidden comment: *)
Capacitor, Ceramic (MLCC), 100nF, ±10%, 25V, X7R, ±10%, SMD 0603; Manufacturer: Murata Electronics; Manufacturer Part Number: GCJ188R71E104KA12D; Package Size: 0603; JLCPCB Basic Part: No; JLCPCB Part Number: C354391; Supplier 1: LCSC; Category: Capacitors - MLCC; Supplier Part Number 1: C354391; Tolerance: ±10%; Voltage Rating: 25V; Temperature Coefficient: X7R; RoHS: Yes; ComponentLink1Description: Datasheet; ComponentLink1URL: https://wmsc.lcsc.com/wmsc/upload/file/pdf/v2/lcsc/1912111437_Murata-Electronics-GCJ188R71E104KA12D_C354391.pdf; ComponentLink2Description: JLCPCB Part URL; ComponentLink2URL: https://jlcpcb.com/partdetail/C354391; ComponentLink3Description: LCSC Part URL; ComponentLink3URL: https://lcsc.com/product-detail/Multilayer-Ceramic-Capacitors-MLCC---SMD-SMT_Murata-Electronics-Murata-Electronics-GCJ188R71E104KA12D_C354391.html
footprint CAP-0603 (0603 (1608M) Capacitor)
pins: 1, 2

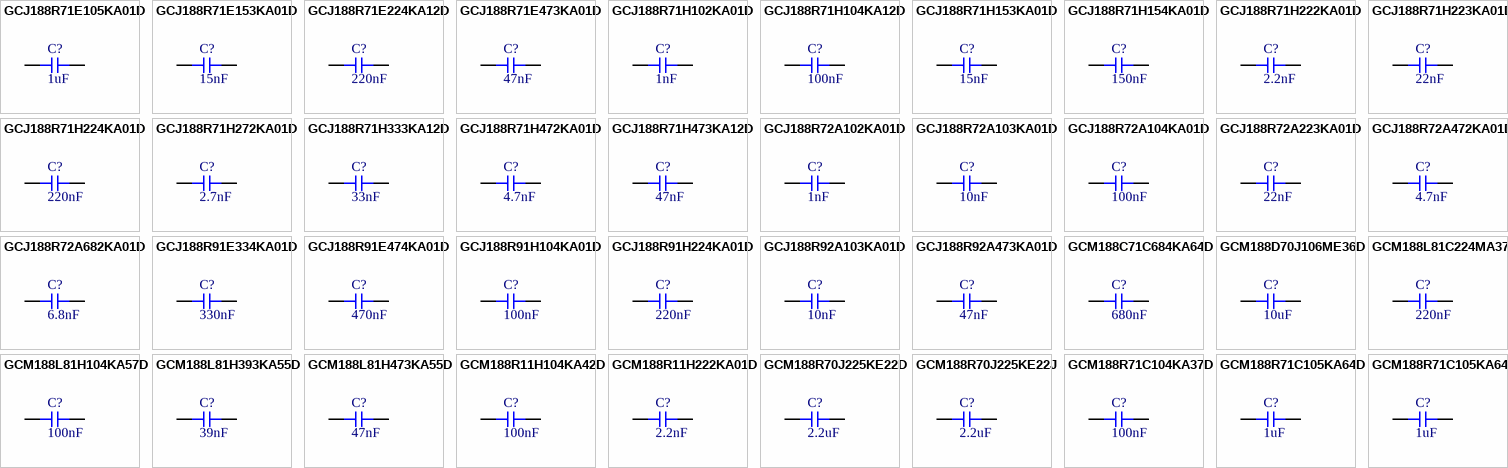
[diagram p67: symbols GCJ188R71E105KA01D to GCM188R71C105KA64J]

## GCJ188R71E105KA01D
designator C?  Capacitance: 1uF  (hidden comment: *)
Capacitor, Ceramic (MLCC), 1uF, ±10%, 25V, ±10%, SMD 0603; Manufacturer: Murata Electronics; Manufacturer Part Number: GCJ188R71E105KA01D; Package Size: 0603; JLCPCB Basic Part: No; JLCPCB Part Number: C908553; Supplier 1: LCSC; Category: Capacitors - MLCC; Supplier Part Number 1: C908553; Tolerance: ±10%; Voltage Rating: 25V; RoHS: Yes; ComponentLink1Description: Datasheet; ComponentLink1URL: https://wmsc.lcsc.com/wmsc/upload/file/pdf/v2/lcsc/2012211538_Murata-Electronics-GCJ188R71E105KA01D_C908553.pdf; ComponentLink2Description: JLCPCB Part URL; ComponentLink2URL: https://jlcpcb.com/partdetail/C908553; ComponentLink3Description: LCSC Part URL; ComponentLink3URL: https://lcsc.com/product-detail/Multilayer-Ceramic-Capacitors-MLCC---SMD-SMT_Murata-Electronics-Murata-Electronics-GCJ188R71E105KA01D_C908553.html
footprint CAP-0603 (0603 (1608M) Capacitor)
pins: 1, 2
